# Altium footprint library Opencore_PCB_Lib.PcbLib: 39 footprints (part 3 of 3)
Each footprint in its own frame and in the unit in brackets; x right, y up, seen from the top. Pads: shape width x height; smd on the part's side, far side on the other; paste and mask are expansions set on the pad; w line width, h text height; cw(c..) or ccw(c..) is an arc to the next point about the centre after c.
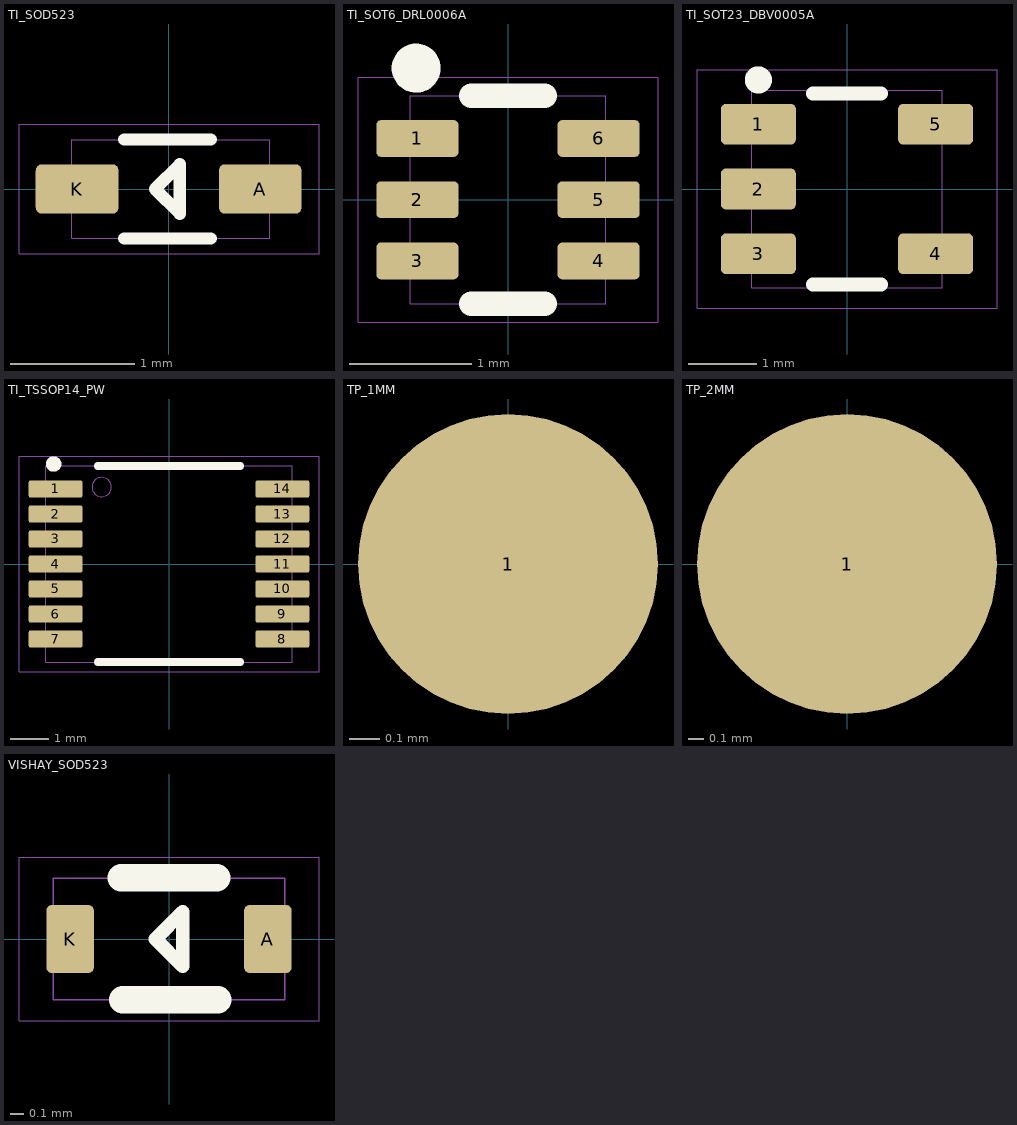
[diagram p2: the footprints below, top view; thin cyan lines are the x and y axes]

## TI_SOD523 [mm]
pads (2):
  rrect25% 0.67x0.4 smd mask+0.05: A(0.74,0) K(-0.74,0)
Top Overlay:
  lines w0.1: -0.36,-0.4 0.34,-0.4 ; -0.36,0.4 0.34,0.4 ; -0.11,0 0.09,0.2 0.09,-0.2 -0.11,0
Top Component Outline:
  lines w0.01: -0.785,-0.4 -0.785,0.4 0.815,0.4 0.815,-0.4 -0.785,-0.4
Top Designator (Mech11):
  text ".Designator" at -0.897,-0.089 h0.25
Top Courtyard:
  lines w0.01: -1.21,-0.525 -1.21,0.525 1.215,0.525 1.215,-0.525 -1.21,-0.525
3D body "DYA0002A.stp": height 0.77, standoff 0, extent -0.785,-0.4 0.815,0.4

## TI_SOT6_DRL0006A [mm] "SOTFL, 6-Leads, Body 1.60x1.60mm, Pitch 0.50mm, IPC Medium Density"
height 0.6
pads (6):
  rrect25% 0.67x0.3 smd mask+0.05: 1(-0.74,0.5) 2(-0.74,0) 3(-0.74,-0.5) 4(0.74,-0.5) 5(0.74,0) 6(0.74,0.5)
Top Overlay:
  circle w0.2: c-0.75,1.075 r0.1
  lines w0.2: -0.3,-0.85 0.3,-0.85 ; -0.3,0.85 0.3,0.85
Top Component Outline:
  lines w0.01: -0.8,-0.85 0.8,-0.85 0.8,0.85 -0.8,0.85 -0.8,-0.85
Top Designator (Mech11):
  text ".Designator" at -1.823,-0.179 h0.5
Top Courtyard:
  lines w0.001: -1.225,-1 -1.225,1 1.225,1 1.225,-1 -1.225,-1
3D body "TI_SOT6_DRL0006A.step": height 0.6, standoff 0, extent -0.8,-0.848 0.8,0.848

## TI_SOT23_DBV0005A [mm]
pads (5):
  rrect25% 1.1x0.6 smd: 1(-1.3,0.95) 2(-1.3,0) 3(-1.3,-0.95) 4(1.3,-0.95) 5(1.3,0.95)
Top Overlay:
  circle w0.2: c-1.3,1.6 r0.1
  lines w0.2: -0.5,-1.4 0.5,-1.4 ; -0.5,1.4 0.5,1.4
Top Component Outline:
  lines w0.01: -1.4,-1.45 1.4,-1.45 1.4,1.45 -1.4,1.45 -1.4,-1.45
Top Designator (Mech11):
  text ".Designator" at -1.823,-0.179 h0.5
Top Courtyard:
  lines w0.001: -2.2,-1.75 2.2,-1.75 2.2,1.75 -2.2,1.75 -2.2,-1.75
3D body "DBV0005A.stp": height 1.2, standoff 0, extent -1.4,-1.45 1.4,1.45

## TI_TSSOP14_PW [mm] "TSOP, 14-Leads, Body 5.00x4.40mm, Pitch 0.65mm, IPC Medium Density"
height 1.2
pads (14):
  rrect25% 1.4x0.45 smd mask+0.05: 1(-2.95,1.95) 2(-2.95,1.3) 3(-2.95,0.65) 4(-2.95,0) 5(-2.95,-0.65) 6(-2.95,-1.3) 7(-2.95,-1.95) 8(2.95,-1.95) 9(2.95,-1.3) 10(2.95,-0.65) 11(2.95,0) 12(2.95,0.65) 13(2.95,1.3) 14(2.95,1.95)
Top Overlay:
  circle w0.2: c-3,2.6 r0.1
  lines w0.2: -1.85,-2.55 1.85,-2.55 ; -1.85,2.55 1.85,2.55
Top Component Outline:
  circle w0.01: c-1.75,2 r0.25
  lines w0.01: -3.2,-2.55 3.2,-2.55 3.2,2.55 -3.2,2.55 -3.2,-2.55
Top Designator (Mech11):
  text ".Designator" at -3.647,-0.357 h1
Top Courtyard:
  lines w0.001: -3.9,-2.8 3.9,-2.8 3.9,2.8 -3.9,2.8 -3.9,-2.8
3D body "TSOP65P640X120-14N.step": height 1.2, standoff 0, extent -3.2,-2.55 3.2,2.55

## TP_1MM [mm] "1MM SMD Round Pad"
pads (1):
  round 1 smd: 1(0,0)

## TP_2MM [mm] "2MM SMD Round Pad"
pads (1):
  round 2 smd: 1(0,0)

## VISHAY_SOD523 [mm]
pads (2):
  rrect25% 0.35x0.5 smd: A(0.725,0) K(-0.725,0)
Top Overlay:
  lines w0.1: -0.1,0 0.1,0.2 0.1,-0.2 -0.1,0
  lines w0.2: -0.35,0.45 0.35,0.45 ; -0.34,-0.446 0.36,-0.446
Top Component Outline:
  lines w0.01: -0.85,-0.444 -0.85,0.445 0.85,0.445 0.85,-0.444 -0.85,-0.444
Top Designator (Mech11):
  text ".Designator" at -0.912,-0.089 h0.25
Top Courtyard:
  lines w0.001: -1.1,-0.6 -1.1,0.6 1.1,0.6 1.1,-0.6 -1.1,-0.6
3D body "CR_02V-G3-08_VIS.step": height 0.77, standoff 0, extent -0.851,-0.444 0.851,0.444